# Altium footprint library General.PcbLib: 446 footprints (part 7 of 28)
Each footprint in its own frame and in the unit in brackets; x right, y up, seen from the top. Pads: shape width x height; smd on the part's side, far side on the other; paste and mask are expansions set on the pad; w line width, h text height; cw(c..) or ccw(c..) is an arc to the next point about the centre after c.
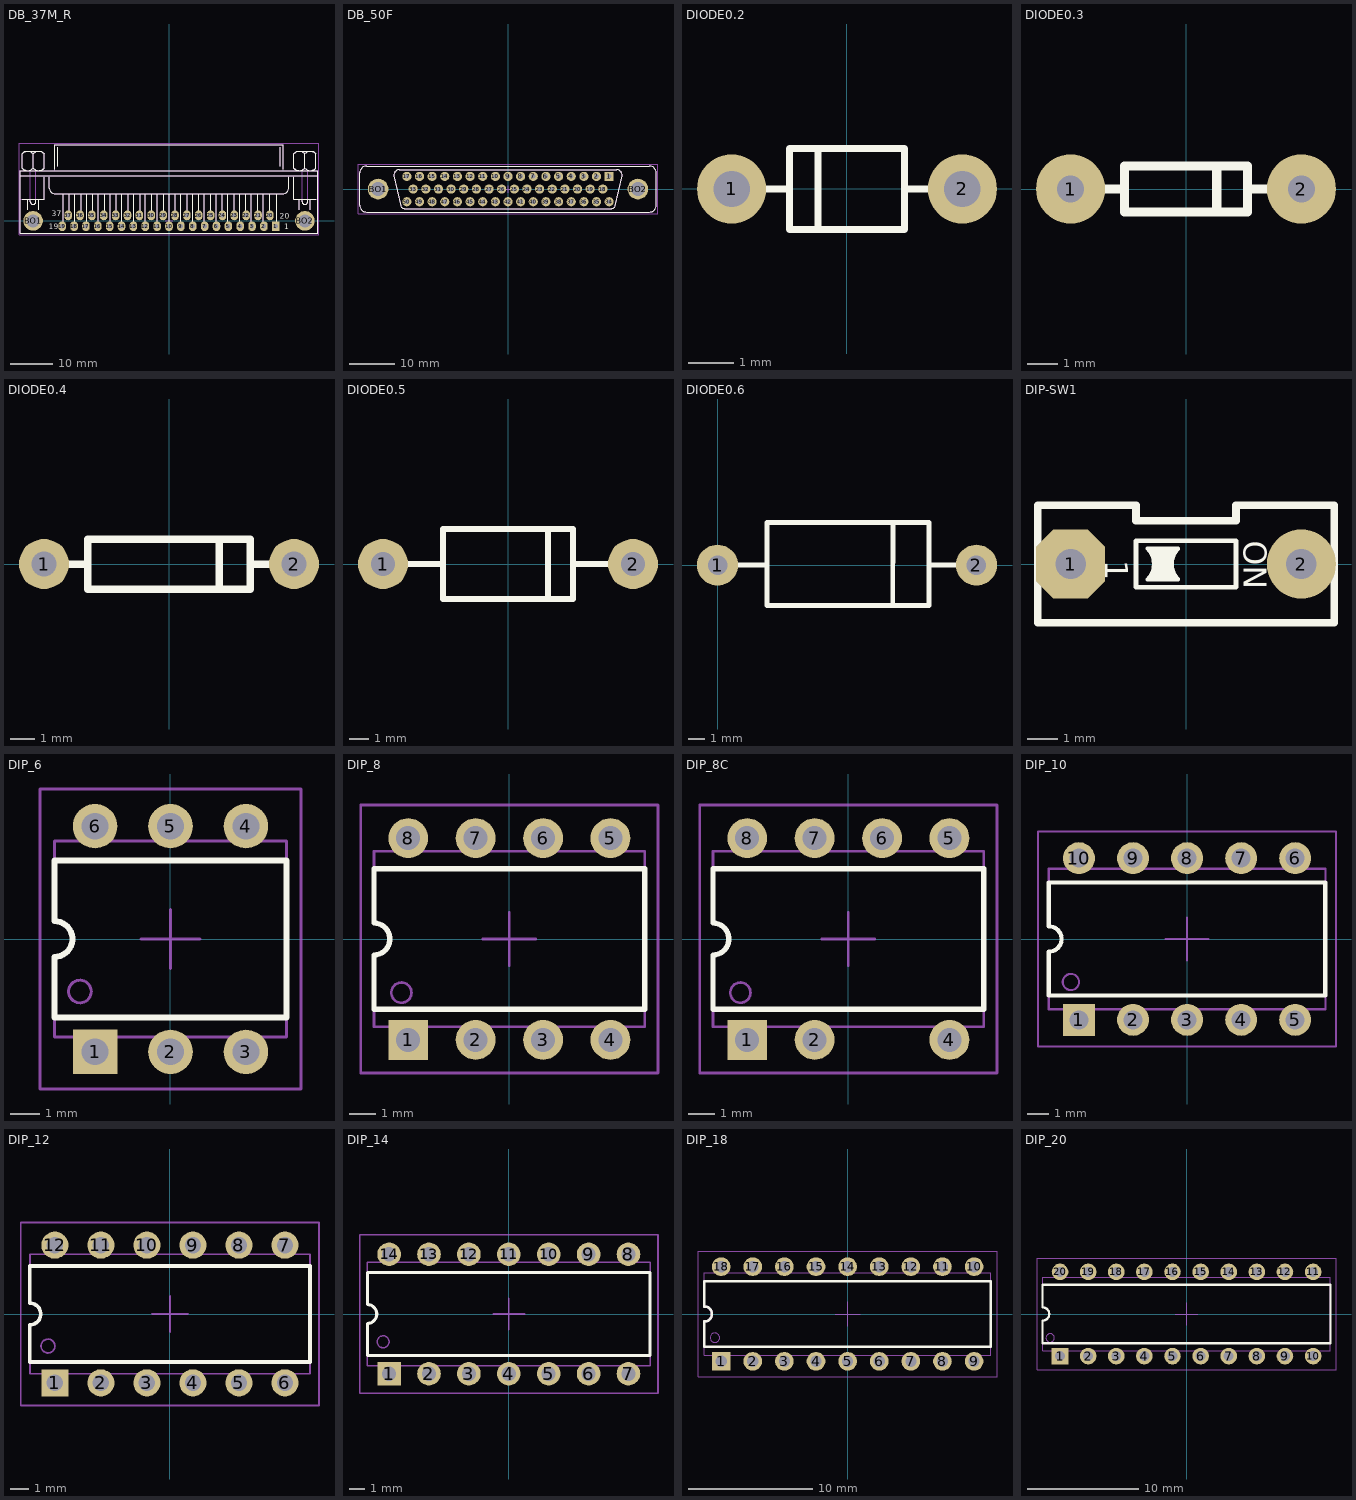
[diagram p6: the footprints below, top view; thin cyan lines are the x and y axes]

## DB_37M_R [mil] "D Type Connector, 37 Pin,Male, RA"
height 492.13
pads (39):
  rect 70x90 hole 40: 1(982.5,-50)
  oval 70x90 hole 40: 2(873.34,-50) 3(764.17,-50) 4(655,-50) 5(545.84,-50) 6(436.67,-50) 7(327.5,-50) 8(218.33,-50) 9(109.17,-50) 10(0,-50) 11(-109.17,-50) 12(-218.33,-50) 13(-327.5,-50) 14(-436.67,-50) 15(-545.84,-50) 16(-655,-50) 17(-764.17,-50) 18(-873.34,-50) 19(-982.5,-50) 20(928.34,50) 21(819.17,50) 22(710.01,50) 23(600.84,50) 24(491.67,50) 25(382.51,50) 26(273.34,50) 27(164.17,50) 28(55.01,50) 29(-54.16,50) 30(-163.33,50) 31(-272.5,50) 32(-381.66,50) 33(-490.83,50) 34(-600,50) 35(-709.16,50) 36(-818.33,50) 37(-927.5,50)
  round 180 hole 120: BO1(-1250,0) BO2(1250,0)
Top Overlay:
  lines w8: -1366.67,416.67 1366.67,416.67 ; -1350.09,483.25 ccw(c-1300,533.33) -1249.91,483.25 ; -1350.09,616.75 cw(c-1300,566.67) -1249.91,616.75 ; -1350,200 -1150,200 -1150,400 ; -1325,458.33 -1350,483.33 -1350,491.67 -1350,616.67 -1325,641.67 -1175,641.67 -1150,616.67 -1150,608.33 -1150,483.33 -1175,458.33 ; -1300,100 -1300,200 ; -1275,200 -1275,175 ccw(c-1250,175) -1225,175 -1225,200 ; -1250.09,483.25 ccw(c-1200,533.33) -1149.91,483.25 ; -1250.09,616.75 cw(c-1200,566.67) -1149.91,616.75 ; -1250,483.33 -1250,616.67 ; -1200,100 -1200,200 ; -1100,400 -1100,300 ccw(c-1050,300) -1050,250 1050,250 ccw(c1050,300) 1100,300 1100,400 ; -1050,475 -1050,700 1050,700 1050,475 ; -1025,500 -1025,675 ; -975,-8.33 -975,250 ; -916.67,91.67 -916.67,250 ; -866.67,-8.33 -866.67,250 ; -808.33,91.67 -808.33,250 ; -758.33,-8.33 -758.33,250 ; -700,91.67 -700,250 ; -650,-8.33 -650,250 ; -591.67,91.67 -591.67,250 ; -541.67,-8.33 -541.67,250 ; -483.33,91.67 -483.33,250 ; -433.33,-8.33 -433.33,250 ; -375,91.67 -375,250 ; -325,-8.33 -325,250 ; -266.67,91.67 -266.67,250 ; -216.67,-8.33 -216.67,250 ; -158.33,91.67 -158.33,250 ; -108.33,-8.33 -108.33,250 ; -50,91.67 -50,250 ; 0,-8.33 0,250 ; 58.33,91.67 58.33,250 ; 108.33,-8.33 108.33,250 ; 166.67,91.67 166.67,250 ; 216.67,-8.33 216.67,250 ; 275,91.67 275,250 ; 325,-8.33 325,250 ; 383.33,91.67 383.33,250 ; 433.33,-8.33 433.33,250 ; 491.67,91.67 491.67,250 ; 541.67,-8.33 541.67,250 ; 600,91.67 600,250 ; 650,-8.33 650,250 ; 708.33,91.67 708.33,250 ; 758.33,-8.33 758.33,250 ; 816.67,91.67 816.67,250 ; 866.67,-8.33 866.67,250 ; 925,91.67 925,250 ; 991.67,-8.33 991.67,250 ; 1025,500 1025,675 ; 1149.91,483.25 ccw(c1200,533.33) 1250.09,483.25 ; 1149.91,616.75 cw(c1200,566.67) 1250.09,616.75 ; 1150,400 1150,200 1350,200 ; 1175,458.33 1150,483.33 1150,491.67 1150,616.67 1175,641.67 1325,641.67 1350,616.67 1350,483.33 1325,458.33 ; 1200,100 1200,200 ; 1225,200 1225,175 ccw(c1250,175) 1275,175 1275,200 ; 1249.91,483.25 ccw(c1300,533.33) 1350.09,483.25 ; 1249.91,616.75 cw(c1300,566.67) 1350.09,616.75 ; 1250,483.33 1250,616.67 ; 1300,100 1300,200 ; -1366.67,-116.67 -1366.67,458.33 1366.67,458.33 1366.67,-116.67 -1366.67,-116.67
  text "19" at -1104.67,-78 h50
  text "37" at -1080,40 h50
  text "1" at 1060,-80 h50
  text "20" at 1020,20 h50
Mechanical 13:
  lines w3.94: -1366.67,200 -1150,200 -1150,416.67 ; -1366.67,416.67 1366.67,416.67 ; -1350.09,483.25 ccw(c-1300,533.33) -1249.91,483.25 ; -1350.09,616.75 cw(c-1300,566.67) -1249.91,616.75 ; -1325,458.33 -1350,483.33 -1350,491.67 -1350,616.67 -1325,641.67 -1175,641.67 -1150,616.67 -1150,608.33 -1150,483.33 -1175,458.33 ; -1300,100 -1300,200 ; -1275,458.33 -1275,200 -1275,175 ccw(c-1250,175) -1225,175 -1225,200 -1225,458.33 ; -1250.09,483.25 ccw(c-1200,533.33) -1149.91,483.25 ; -1250.09,616.75 cw(c-1200,566.67) -1149.91,616.75 ; -1250,483.33 -1250,616.67 ; -1200,100 -1200,200 ; -1100,416.67 -1100,300 ccw(c-1050,300) -1050,250 1050,250 ccw(c1050,300) 1100,300 1100,416.67 ; -1050,458.33 -1050,700 1050,700 1050,458.33 ; -1025,500 -1025,675 ; -975,-8.33 -975,250 ; -916.67,91.67 -916.67,250 ; -866.67,-8.33 -866.67,250 ; -808.33,91.67 -808.33,250 ; -758.33,-8.33 -758.33,250 ; -700,91.67 -700,250 ; -650,-8.33 -650,250 ; -591.67,91.67 -591.67,250 ; -541.67,-8.33 -541.67,250 ; -483.33,91.67 -483.33,250 ; -433.33,-8.33 -433.33,250 ; -375,91.67 -375,250 ; -325,-8.33 -325,250 ; -266.67,91.67 -266.67,250 ; -216.67,-8.33 -216.67,250 ; -158.33,91.67 -158.33,250 ; -108.33,-8.33 -108.33,250 ; -50,91.67 -50,250 ; 0,-8.33 0,250 ; 58.33,91.67 58.33,250 ; 108.33,-8.33 108.33,250 ; 166.67,91.67 166.67,250 ; 216.67,-8.33 216.67,250 ; 275,91.67 275,250 ; 325,-8.33 325,250 ; 383.33,91.67 383.33,250 ; 433.33,-8.33 433.33,250 ; 491.67,91.67 491.67,250 ; 541.67,-8.33 541.67,250 ; 600,91.67 600,250 ; 650,-8.33 650,250 ; 708.33,91.67 708.33,250 ; 758.33,-8.33 758.33,250 ; 816.67,91.67 816.67,250 ; 866.67,-8.33 866.67,250 ; 925,91.67 925,250 ; 991.67,-8.33 991.67,250 ; 1025,500 1025,675 ; 1149.91,483.25 ccw(c1200,533.33) 1250.09,483.25 ; 1149.91,616.75 cw(c1200,566.67) 1250.09,616.75 ; 1150,416.67 1150,200 1366.67,200 ; 1175,458.33 1150,483.33 1150,491.67 1150,616.67 1175,641.67 1325,641.67 1350,616.67 1350,483.33 1325,458.33 ; 1200,100 1200,200 ; 1225.02,458.31 1225.02,199.98 1225,175 ccw(c1250,175) 1275,175 1275,200 1275.02,458.31 ; 1249.91,483.25 ccw(c1300,533.33) 1350.09,483.25 ; 1249.91,616.75 cw(c1300,566.67) 1350.09,616.75 ; 1250,483.33 1250,616.67 ; 1300,100 1300,200 ; -1366.67,-116.67 1366.67,-116.67 1366.67,458.33 -1366.67,458.33 -1366.67,-116.67
Mechanical 15:
  lines w3.94: -35,0 0,0 ; 0,-35 0,0 ; 0,35 0,0 ; 35,0 0,0 ; -1380,-130 1380,-130 1380,715 -1380,715 -1380,-130
3D body: height 492.13, standoff 0, extent -1100.5,249.55 1100.45,416.67
3D body: height 492.13, standoff 0, extent 1150.02,200.02 1366.65,416.65
3D body: height 354.33, standoff 118.11, extent -1049.98,458.35 1049.98,699.98
3D body: height 492.13, standoff 0, extent -1366.65,416.69 1366.65,458.31
3D body: height 492.13, standoff 0, extent -1366.65,200.02 -1150.02,416.65
3D body: height 129.92, standoff 0, extent -1366.65,-116.65 1366.65,416.65
3D body: height 314.96, standoff 157.48, extent -1350.09,458.33 -1149.91,641.67
3D body: height 314.96, standoff 157.48, extent 1149.91,458.33 1350,641.67
3D body: height 275.59, standoff 196.85, extent 1224.44,149.98 1275.02,458.31
3D body: height 275.59, standoff 196.85, extent -1275.58,150 -1225,458.33

## DB_50F [mil] "D Type Connector, 50 Pin,FeMale, ST"
height 433.07
pads (52):
  rect 80x80 hole 40: 1(880,110)
  round 80 hole 40: 2(770,110) 3(660,110) 4(550,110) 5(440,110) 6(330,110) 7(220,110) 8(110,110) 9(0,110) 10(-110,110) 11(-220,110) 12(-330,110) 13(-440,110) 14(-550,110) 15(-660,110) 16(-770,110) 17(-880,110) 18(825,0) 19(715,0) 20(605,0) 21(495,0) 22(385,0) 23(275,0) 24(165,0) 25(55,0) 26(-55,0) 27(-165,0) 28(-275,0) 29(-385,0) 30(-495,0) 31(-605,0) 32(-715,0) 33(-825,0) 34(880,-110) 35(770,-110) 36(660,-110) 37(550,-110) 38(440,-110) 39(330,-110) 40(220,-110) 41(110,-110) 42(0,-110) 43(-110,-110) 44(-220,-110) 45(-330,-110) 46(-440,-110) 47(-550,-110) 48(-660,-110) 49(-770,-110) 50(-880,-110)
  round 180 hole 120: BO1(-1130,0) BO2(1130,0)
Top Overlay:
  lines w10: -995.23,115 cw(c-940,115) -944.81,170.02 ; -995,115 -935,-145 ; -945,170 945,170 ; -934.85,-145.3 ccw(c-895,-125) -895,-169.72 ; -895,-170 895,-170 ; 895,-169.72 ccw(c895,-125) 934.85,-145.3 ; 935,-145 995,115 ; 944.81,170.02 cw(c940,115) 995.23,115 ; -1290,-140 ccw(c-1230,-140) -1230,-200 1230,-200 ccw(c1230,-140) 1290,-140 1290,140 ccw(c1230,140) 1230,200 -1230,200 ccw(c-1230,140) -1290,140 -1290,-140
Mechanical 13:
  lines w3.94: -995.23,115 cw(c-940,115) -944.81,170.02 ; -995,115 -935,-145 ; -945,170 945,170 ; -934.85,-145.3 ccw(c-895,-125) -895,-169.72 ; -895,-170 895,-170 ; 895,-169.72 ccw(c895,-125) 934.85,-145.3 ; 935,-145 995,115 ; 944.81,170.02 cw(c940,115) 995.23,115 ; -1290,-140 ccw(c-1230,-140) -1230,-200 1230,-200 ccw(c1230,-140) 1290,-140 1290,140 ccw(c1230,140) 1230,200 -1230,200 ccw(c-1230,140) -1290,140 -1290,-140
Mechanical 15:
  lines w3.94: -30,0 0,0 ; 0,-30 0,0 ; 0,30 0,0 ; 30,0 0,0 ; -1305,-215 -1305,216 1305,216 1305,-215 -1305,-215
3D body: height 433.07, standoff 0, extent -995.23,-170 995,170
3D body: height 208, standoff 200, extent -1289.98,-199.98 1289.98,199.98

## DIODE0.2 [mil]
pads (2):
  round 60 hole 31.5: 1(-100,0) 2(100,0)
Top Overlay:
  lines w6: -70,0 -50,0 ; -25,-35 -25,35 ; 50,0 70,0 ; -50,-35 50,-35 50,35 -50,35 -50,-35

## DIODE0.3 [mil]
pads (2):
  round 90 hole 35.43: 1(-150,0) 2(150,0)
Top Overlay:
  lines w12: -110,0 -80,0 ; 40,-30 40,30 ; 80,0 110,0 ; -80,-30 80,-30 80,30 -80,30 -80,-30

## DIODE0.4 [mil]
pads (2):
  round 80 hole 39.37: 1(-200,0) 2(200,0)
Top Overlay:
  lines w12: -160,0 -130,0 ; 80,-40 80,40 ; 130,0 160,0 ; -130,-40 -130,40 130,40 130,-40 -130,-40

## DIODE0.5 [mm]
pads (2):
  round 2.54 hole 1.2: 1(-6.35,0) 2(6.35,0)
Top Overlay:
  lines w0.305: -5.207,0 -3.302,0 ; 2.032,-1.778 2.032,1.778 ; 3.302,0 5.207,0 ; -3.302,-1.778 3.302,-1.778 3.302,1.778 -3.302,1.778 -3.302,-1.778
3D body "Diod DO-201AD Horizontal.STEP": height 5.8, standoff -3.3, extent -7.589,-2.811 7.701,2.799

## DIODE0.6 [mm]
pads (2):
  round 2.54 hole 1.2: 1(0,0) 2(16,0)
Top Overlay:
  lines w0.305: 1.143,0 3.048,0 ; 10.829,-2.461 10.83,2.64 ; 13.091,0 16,0 ; 3.048,-2.499 3.048,2.632 13.072,2.632 13.072,-2.499 3.048,-2.499
3D body "Diod DO-201AD Horizontal.STEP": height 5.8, standoff -3.3, extent 0.386,-2.862 15.676,2.748

## DIP-SW1 [mil]
pads (2):
  oct 90x90 hole 39.37: 1(-150,0)
  round 90 hole 39.37: 2(150,0)
Top Overlay:
  lines w5: -31,-9 -29,4 -32,8 -25,8 -29,-3 -25,-10 -35,-10 -31,0 -36,11 -21,11 -26,-1 -20,-13 -40,-13 -34,2 -41,14 -17,14 -22,-1 -16,-17 -44,-17 -38,3 -45,17 -14,17 ; -50,-20 ccw(c-70,0) -50,20 -10,20 ccw(c10,0) -10,-20 -50,-20
  lines w6: -64.96,-30 -64.96,30 64.96,30 64.96,-30 -64.96,-30
  lines w10: -192.91,-76.38 192.91,-76.38 192.91,76.38 64.96,76.38 64.96,56.38 -64.96,56.38 -64.96,76.38 -192.91,76.38 -192.91,-76.38
  text "ON" at 75,30 h30
  text "1" at -105,5 h30

## DIP_6 [mm] "DIP6"
height 5.06
pads (6):
  rect 1.5x1.5 hole 0.9: 1(-2.54,-3.8)
  round 1.5 hole 0.9: 2(0,-3.8) 3(2.54,-3.8) 4(2.54,3.8) 5(0,3.8) 6(-2.54,3.8)
Top Overlay:
  lines w0.2: -3.9,-2.65 3.9,-2.65 3.9,2.65 -3.9,2.65 -3.9,0.6 cw(c-3.9,0) -3.9,-0.6 -3.9,-2.65
Mechanical 13:
  circle w0.1: c-3.048,-1.768 r0.381
  lines w0.1: -3.9,-3.3 -3.9,-0.6 ccw(c-3.9,0) -3.9,0.6 -3.9,3.3 3.9,3.3 3.9,-3.3 -3.9,-3.3
Mechanical 15:
  lines w0.1: -1,0 1,0 ; 0,-1 0,1 ; -4.4,-5.05 -4.4,5.05 4.4,5.05 4.4,-5.05 -4.4,-5.05
3D body: height 5.06, standoff 0, extent -3.9,-3.3 3.9,3.3

## DIP_8 [mm] "Dual-In-line Package,300mil body;8 pin"
height 5.06
pads (8):
  rect 1.5x1.5 hole 0.9: 1(-3.81,-3.8)
  round 1.5 hole 0.9: 2(-1.27,-3.8) 3(1.27,-3.8) 4(3.81,-3.8) 5(3.81,3.8) 6(1.27,3.8) 7(-1.27,3.8) 8(-3.81,3.8)
Top Overlay:
  lines w0.2: -5.1,-2.65 -5.1,-0.6 ccw(c-5.1,0) -5.1,0.6 -5.1,2.65 5.1,2.65 5.1,-2.65 -5.1,-2.65
Mechanical 13:
  circle w0.1: c-4.064,-2.022 r0.381
  lines w0.1: -5.1,-3.3 5.1,-3.3 5.1,3.3 -5.1,3.3 -5.1,0.6 cw(c-5.1,0) -5.1,-0.6 -5.1,-3.3
Mechanical 15:
  lines w0.1: -1,0 1,0 ; 0,-1 0,1 ; -5.6,-5.05 -5.6,5.05 5.6,5.05 5.6,-5.05 -5.6,-5.05
3D body: height 5.06, standoff 0, extent -5.1,-3.3 5.1,3.3

## DIP_8C [mm] "Dual-In-line Package,300mil body;8 pin"
height 5.06
pads (7):
  rect 1.5x1.5 hole 0.9: 1(-3.81,-3.8)
  round 1.5 hole 0.9: 2(-1.27,-3.8) 4(3.81,-3.8) 5(3.81,3.8) 6(1.27,3.8) 7(-1.27,3.8) 8(-3.81,3.8)
Top Overlay:
  lines w0.2: -5.1,-2.65 5.1,-2.65 5.1,2.65 -5.1,2.65 -5.1,0.6 cw(c-5.1,0) -5.1,-0.6 -5.1,-2.65
Mechanical 13:
  circle w0.1: c-4.064,-2.022 r0.381
  lines w0.1: -5.1,-3.3 -5.1,-0.6 ccw(c-5.1,0) -5.1,0.6 -5.1,3.3 5.1,3.3 5.1,-3.3 -5.1,-3.3
Mechanical 15:
  lines w0.1: -1,0 1,0 ; 0,-1 0,1 ; -5.6,-5.05 5.6,-5.05 5.6,5.05 -5.6,5.05 -5.6,-5.05
3D body: height 5.06, standoff 0, extent -5.1,-3.3 5.1,3.3

## DIP_10 [mm] "Dual-In-line Package,300mil body;10 pin"
height 5.06
pads (10):
  rect 1.5x1.5 hole 0.9: 1(-5.08,-3.8)
  round 1.5 hole 0.9: 2(-2.54,-3.8) 3(0,-3.8) 4(2.54,-3.8) 5(5.08,-3.8) 6(5.08,3.8) 7(2.54,3.8) 8(0,3.8) 9(-2.54,3.8) 10(-5.08,3.8)
Top Overlay:
  lines w0.2: -6.5,-2.65 6.5,-2.65 6.5,2.65 -6.5,2.65 -6.5,0.6 cw(c-6.5,0) -6.5,-0.6 -6.5,-2.65
Mechanical 13:
  circle w0.1: c-5.461,-2.022 r0.381
  lines w0.1: -6.5,-3.3 -6.5,-0.6 ccw(c-6.5,0) -6.5,0.6 -6.5,3.3 6.5,3.3 6.5,-3.3 -6.5,-3.3
Mechanical 15:
  lines w0.1: -1,0 1,0 ; 0,-1 0,1 ; -7,-5.05 -7,5.05 7,5.05 7,-5.05 -7,-5.05
3D body: height 5.06, standoff 0, extent -6.5,-3.3 6.5,3.3

## DIP_12 [mm] "Dual-In-line Package,300mil body;12 pin"
height 5.06
pads (12):
  rect 1.5x1.5 hole 0.9: 1(-6.35,-3.8)
  round 1.5 hole 0.9: 2(-3.81,-3.8) 3(-1.27,-3.8) 4(1.27,-3.8) 5(3.81,-3.8) 6(6.35,-3.8) 7(6.35,3.8) 8(3.81,3.8) 9(1.27,3.8) 10(-1.27,3.8) 11(-3.81,3.8) 12(-6.35,3.8)
Top Overlay:
  lines w0.2: -7.73,-2.65 -7.73,-0.6 ccw(c-7.73,0) -7.73,0.6 -7.73,2.65 7.73,2.65 7.73,-2.65 -7.73,-2.65
Mechanical 13:
  circle w0.1: c-6.731,-1.768 r0.381
  lines w0.1: -7.73,-3.3 7.73,-3.3 7.73,3.3 -7.73,3.3 -7.73,0.6 cw(c-7.73,0) -7.73,-0.6 -7.73,-3.3
Mechanical 15:
  lines w0.1: -1,0 1,0 ; 0,-1 0,1 ; -8.23,-5.05 -8.23,5.05 8.23,5.05 8.23,-5.05 -8.23,-5.05
3D body: height 5.06, standoff 0, extent -7.73,-3.3 7.73,3.3

## DIP_14 [mm] "Dual-In-line Package,300mil body;14 pin"
height 5.06
pads (14):
  rect 1.5x1.5 hole 0.9: 1(-7.62,-3.8)
  round 1.5 hole 0.9: 2(-5.08,-3.8) 3(-2.54,-3.8) 4(0,-3.8) 5(2.54,-3.8) 6(5.08,-3.8) 7(7.62,-3.8) 8(7.62,3.8) 9(5.08,3.8) 10(2.54,3.8) 11(0,3.8) 12(-2.54,3.8) 13(-5.08,3.8) 14(-7.62,3.8)
Top Overlay:
  lines w0.2: -9,-2.65 -9,-0.6 ccw(c-9,0) -9,0.6 -9,2.65 9,2.65 9,-2.65 -9,-2.65
Mechanical 13:
  circle w0.1: c-8.001,-1.768 r0.381
  lines w0.1: -9,-3.3 9,-3.3 9,3.3 -9,3.3 -9,0.6 cw(c-9,0) -9,-0.6 -9,-3.3
Mechanical 15:
  lines w0.1: -1,0 1,0 ; 0,-1 0,1 ; -9.5,-5.05 -9.5,5.05 9.5,5.05 9.5,-5.05 -9.5,-5.05
3D body: height 5.06, standoff 0, extent -9,-3.3 9,3.3

## DIP_18 [mm] "Dual-In-line Package,300mil body;18 pin"
height 5.06
pads (18):
  rect 1.5x1.5 hole 0.9: 1(-10.16,-3.8)
  round 1.5 hole 0.9: 2(-7.62,-3.8) 3(-5.08,-3.8) 4(-2.54,-3.8) 5(0,-3.8) 6(2.54,-3.8) 7(5.08,-3.8) 8(7.62,-3.8) 9(10.16,-3.8) 10(10.16,3.8) 11(7.62,3.8) 12(5.08,3.8) 13(2.54,3.8) 14(0,3.8) 15(-2.54,3.8) 16(-5.08,3.8) 17(-7.62,3.8) 18(-10.16,3.8)
Top Overlay:
  lines w0.2: -11.5,-2.65 -11.5,-0.6 ccw(c-11.5,0) -11.5,0.6 -11.5,2.65 11.5,2.65 11.5,-2.65 -11.5,-2.65
Mechanical 13:
  circle w0.1: c-10.668,-1.905 r0.381
  lines w0.1: -11.5,-0.6 -11.5,-3.3 11.5,-3.3 11.5,3.3 -11.5,3.3 -11.5,0.6
  lines w0.2: -11.5,-0.6 ccw(c-11.5,0) -11.5,0.6
Mechanical 15:
  lines w0.1: -1,0 1,0 ; 0,-1 0,1 ; -12,-5.05 12,-5.05 12,5.05 -12,5.05 -12,-5.05
3D body: height 5.06, standoff 0, extent -11.5,-3.3 11.5,3.3

## DIP_20 [mm] "Dual-In-line Package,300mil body;20 pin"
height 5.06
pads (20):
  rect 1.5x1.5 hole 0.9: 1(-11.43,-3.8)
  round 1.5 hole 0.9: 2(-8.89,-3.8) 3(-6.35,-3.8) 4(-3.81,-3.8) 5(-1.27,-3.8) 6(1.27,-3.8) 7(3.81,-3.8) 8(6.35,-3.8) 9(8.89,-3.8) 10(11.43,-3.8) 11(11.43,3.8) 12(8.89,3.8) 13(6.35,3.8) 14(3.81,3.8) 15(1.27,3.8) 16(-1.27,3.8) 17(-3.81,3.8) 18(-6.35,3.8) 19(-8.89,3.8) 20(-11.43,3.8)
Top Overlay:
  lines w0.2: -13,-2.65 13,-2.65 13,2.65 -13,2.65 -13,0.6 cw(c-13,0) -13,-0.6 -13,-2.65
Mechanical 13:
  circle w0.1: c-12.319,-2.159 r0.381
  lines w0.1: -13,-3.3 13,-3.3 13,3.3 -13,3.3 -13,0.6 cw(c-13,0) -13,-0.6 -13,-3.3
Mechanical 15:
  lines w0.1: -1,0 1,0 ; 0,-1 0,1 ; -13.5,-5.05 -13.5,5.05 13.5,5.05 13.5,-5.05 -13.5,-5.05
3D body: height 5.06, standoff 0, extent -13,-3.3 13,3.3